# Altium footprint library SVP_Phoenix.PcbLib: 53 footprints (part 1 of 4)
Each footprint in its own frame and in the unit in brackets; x right, y up, seen from the top. Pads: shape width x height; smd on the part's side, far side on the other; paste and mask are expansions set on the pad; w line width, h text height; cw(c..) or ccw(c..) is an arc to the next point about the centre after c.
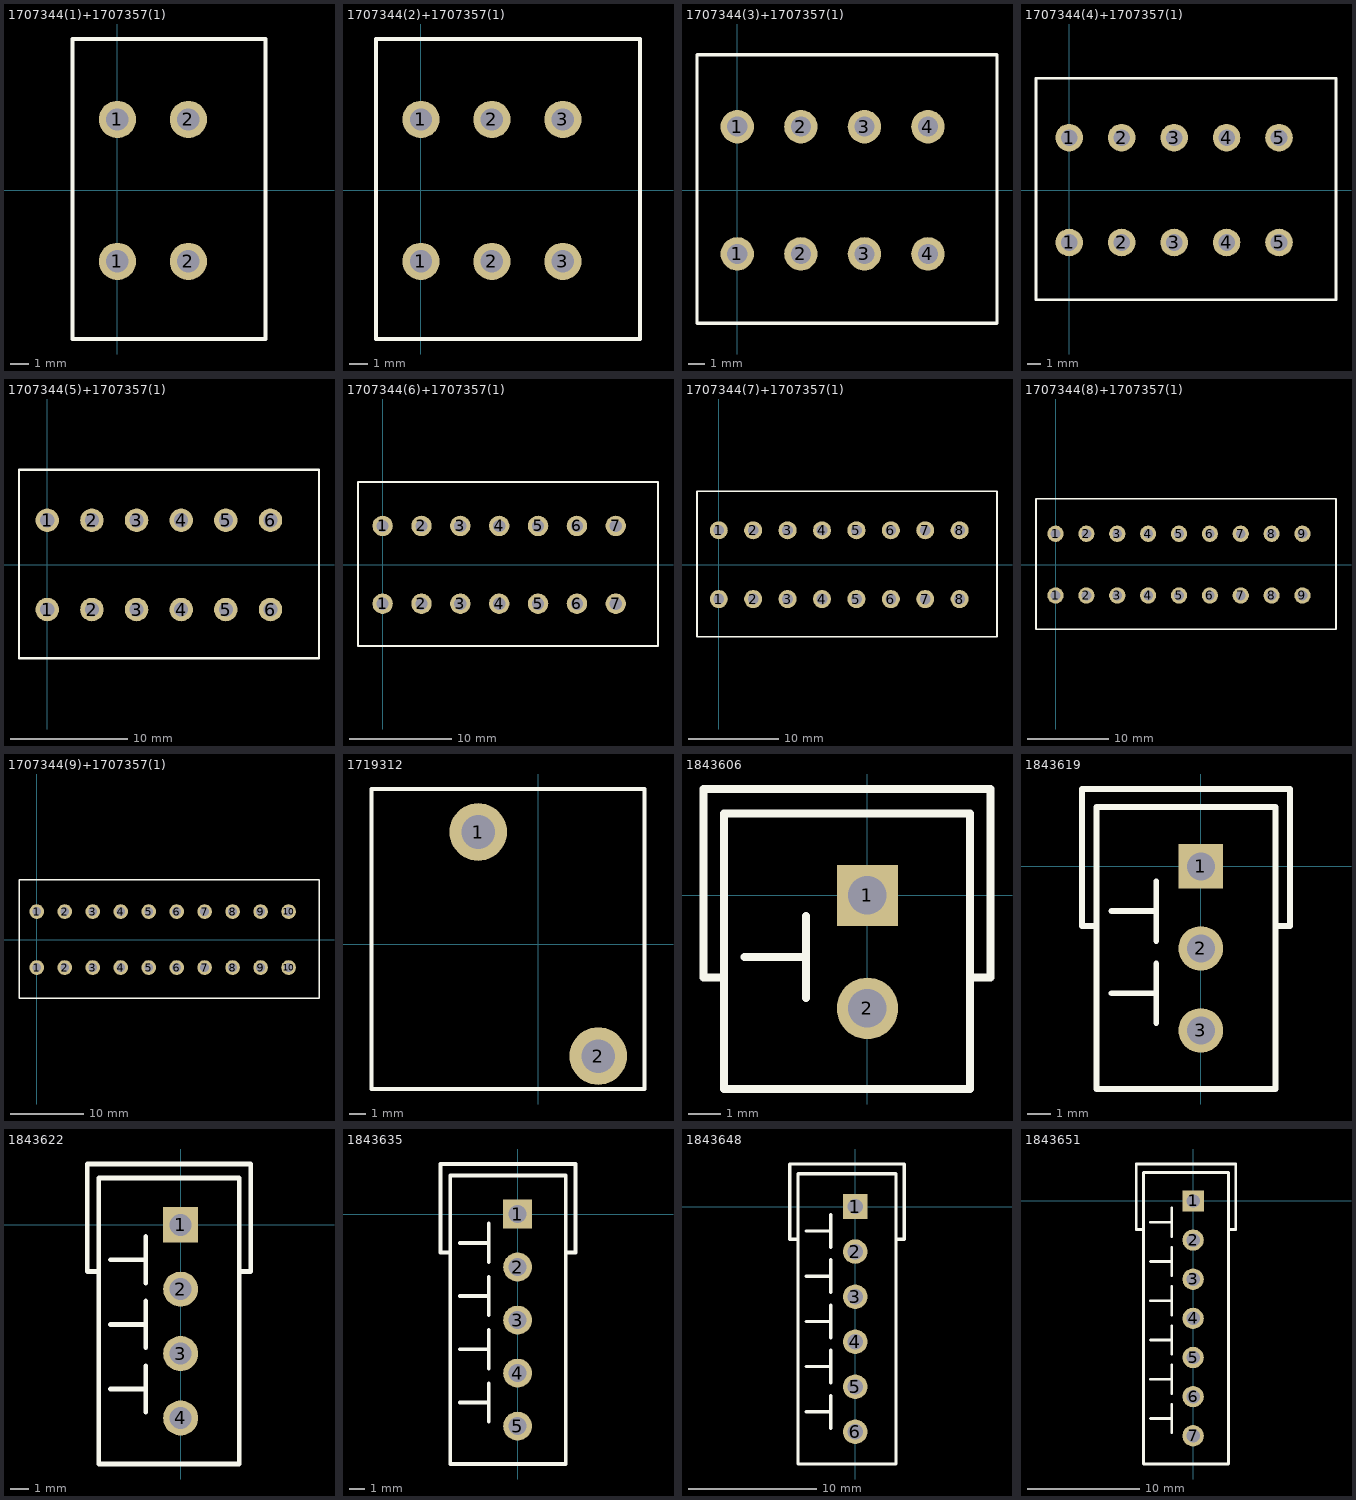
[diagram p0: the footprints below, top view; thin cyan lines are the x and y axes]

## 1707344(1)+1707357(1) [mm] "2 position 3.81mm spring terminals, vertical"
pads (4):
  round 2 hole 1.2: 1(0,-3.81) 1(0,3.81) 2(3.81,-3.81) 2(3.81,3.81)
Top Overlay:
  lines w0.203: -2.413,-7.976 -2.413,8.128 7.95,8.128 7.95,-7.976 -2.413,-7.976
3D body "1707344_01.stp": height 15.56, standoff -3.49, extent -2.311,-7.874 3.299,8.026
3D body "1707357_02.stp": height 15.56, standoff -3.49, extent 1.499,-7.874 7.849,8.026

## 1707344(2)+1707357(1) [mm] "3 position 3.81mm spring terminals, vertical"
pads (6):
  round 2 hole 1.2: 1(0,-3.81) 1(0,3.81) 2(3.81,-3.81) 2(3.81,3.81) 3(7.62,-3.81) 3(7.62,3.81)
Top Overlay:
  lines w0.203: -2.413,-7.976 11.76,-7.976 11.76,8.128 -2.413,8.128 -2.413,-7.976
3D body "1707344_01.stp": height 15.56, standoff -3.49, extent 1.499,-7.874 7.109,8.026
3D body "1707357_02.stp": height 15.56, standoff -3.49, extent 5.309,-7.874 11.659,8.026
3D body "1707344_01.stp": height 15.56, standoff -3.49, extent -2.311,-7.874 3.299,8.026

## 1707344(3)+1707357(1) [mm] "4 position 3.81mm spring terminals, vertical"
pads (8):
  round 2 hole 1.2: 1(0,-3.81) 1(0,3.81) 2(3.81,-3.81) 2(3.81,3.81) 3(7.62,-3.81) 3(7.62,3.81) 4(11.43,-3.81) 4(11.43,3.81)
Top Overlay:
  lines w0.203: -2.413,-7.976 15.57,-7.976 15.57,8.128 -2.413,8.128 -2.413,-7.976
3D body "1707344_01.stp": height 15.56, standoff -3.49, extent 5.309,-7.874 10.919,8.026
3D body "1707357_02.stp": height 15.56, standoff -3.49, extent 9.119,-7.874 15.469,8.026
3D body "1707344_01.stp": height 15.56, standoff -3.49, extent 1.499,-7.874 7.109,8.026
3D body "1707344_01.stp": height 15.56, standoff -3.49, extent -2.311,-7.874 3.299,8.026

## 1707344(4)+1707357(1) [mm] "5 position 3.81mm spring terminals, vertical"
pads (10):
  round 2 hole 1.2: 1(0,-3.81) 1(0,3.81) 2(3.81,-3.81) 2(3.81,3.81) 3(7.62,-3.81) 3(7.62,3.81) 4(11.43,-3.81) 4(11.43,3.81) 5(15.24,-3.81) 5(15.24,3.81)
Top Overlay:
  lines w0.203: -2.413,-7.976 19.38,-7.976 19.38,8.128 -2.413,8.128 -2.413,-7.976
3D body "1707344_01.stp": height 15.56, standoff -3.49, extent 5.309,-7.874 10.919,8.026
3D body "1707344_01.stp": height 15.56, standoff -3.49, extent 1.499,-7.874 7.109,8.026
3D body "1707344_01.stp": height 15.56, standoff -3.49, extent -2.311,-7.874 3.299,8.026
3D body "1707357_02.stp": height 15.56, standoff -3.49, extent 12.929,-7.874 19.279,8.026
3D body "1707344_01.stp": height 15.56, standoff -3.49, extent 9.119,-7.874 14.729,8.026

## 1707344(5)+1707357(1) [mm] "6 position 3.81mm spring terminals, vertical"
pads (12):
  round 2 hole 1.2: 1(0,-3.81) 1(0,3.81) 2(3.81,-3.81) 2(3.81,3.81) 3(7.62,-3.81) 3(7.62,3.81) 4(11.43,-3.81) 4(11.43,3.81) 5(15.24,-3.81) 5(15.24,3.81) 6(19.05,-3.81) 6(19.05,3.81)
Top Overlay:
  lines w0.203: -2.413,-7.976 23.19,-7.976 23.19,8.128 -2.413,8.128 -2.413,-7.976
3D body "1707344_01.stp": height 15.56, standoff -3.49, extent 5.309,-7.874 10.919,8.026
3D body "1707344_01.stp": height 15.56, standoff -3.49, extent 1.499,-7.874 7.109,8.026
3D body "1707344_01.stp": height 15.56, standoff -3.49, extent -2.311,-7.874 3.299,8.026
3D body "1707344_01.stp": height 15.56, standoff -3.49, extent 9.119,-7.874 14.729,8.026
3D body "1707357_02.stp": height 15.56, standoff -3.49, extent 16.739,-7.874 23.089,8.026
3D body "1707344_01.stp": height 15.56, standoff -3.49, extent 12.929,-7.874 18.539,8.026

## 1707344(6)+1707357(1) [mm] "7 position 3.81mm spring terminals, vertical"
pads (14):
  round 2 hole 1.2: 1(0,-3.81) 1(0,3.81) 2(3.81,-3.81) 2(3.81,3.81) 3(7.62,-3.81) 3(7.62,3.81) 4(11.43,-3.81) 4(11.43,3.81) 5(15.24,-3.81) 5(15.24,3.81) 6(19.05,-3.81) 6(19.05,3.81) 7(22.86,-3.81) 7(22.86,3.81)
Top Overlay:
  lines w0.203: -2.413,-7.976 -2.413,8.128 27,8.128 27,-7.976 -2.413,-7.976
3D body "1707344_01.stp": height 15.56, standoff -3.49, extent 16.739,-7.874 22.349,8.026
3D body "1707357_02.stp": height 15.56, standoff -3.49, extent 20.549,-7.874 26.899,8.026
3D body "1707344_01.stp": height 15.56, standoff -3.49, extent 12.929,-7.874 18.539,8.026
3D body "1707344_01.stp": height 15.56, standoff -3.49, extent 9.119,-7.874 14.729,8.026
3D body "1707344_01.stp": height 15.56, standoff -3.49, extent -2.311,-7.874 3.299,8.026
3D body "1707344_01.stp": height 15.56, standoff -3.49, extent 1.499,-7.874 7.109,8.026
3D body "1707344_01.stp": height 15.56, standoff -3.49, extent 5.309,-7.874 10.919,8.026

## 1707344(7)+1707357(1) [mm] "8 position 3.81mm spring terminals, vertical"
pads (16):
  round 2 hole 1.2: 1(0,-3.81) 1(0,3.81) 2(3.81,-3.81) 2(3.81,3.81) 3(7.62,-3.81) 3(7.62,3.81) 4(11.43,-3.81) 4(11.43,3.81) 5(15.24,-3.81) 5(15.24,3.81) 6(19.05,-3.81) 6(19.05,3.81) 7(22.86,-3.81) 7(22.86,3.81) 8(26.67,-3.81) 8(26.67,3.81)
Top Overlay:
  lines w0.203: -2.413,-7.976 30.81,-7.976 30.81,8.128 -2.413,8.128 -2.413,-7.976
3D body "1707344_01.stp": height 15.56, standoff -3.49, extent 20.549,-7.874 26.159,8.026
3D body "1707357_02.stp": height 15.56, standoff -3.49, extent 24.359,-7.874 30.709,8.026
3D body "1707344_01.stp": height 15.56, standoff -3.49, extent 5.309,-7.874 10.919,8.026
3D body "1707344_01.stp": height 15.56, standoff -3.49, extent 1.499,-7.874 7.109,8.026
3D body "1707344_01.stp": height 15.56, standoff -3.49, extent -2.311,-7.874 3.299,8.026
3D body "1707344_01.stp": height 15.56, standoff -3.49, extent 9.119,-7.874 14.729,8.026
3D body "1707344_01.stp": height 15.56, standoff -3.49, extent 12.929,-7.874 18.539,8.026
3D body "1707344_01.stp": height 15.56, standoff -3.49, extent 16.739,-7.874 22.349,8.026

## 1707344(8)+1707357(1) [mm] "9 position 3.81mm spring terminals, vertical"
pads (18):
  round 2 hole 1.2: 1(0,-3.81) 1(0,3.81) 2(3.81,-3.81) 2(3.81,3.81) 3(7.62,-3.81) 3(7.62,3.81) 4(11.43,-3.81) 4(11.43,3.81) 5(15.24,-3.81) 5(15.24,3.81) 6(19.05,-3.81) 6(19.05,3.81) 7(22.86,-3.81) 7(22.86,3.81) 8(26.67,-3.81) 8(26.67,3.81) 9(30.48,-3.81) 9(30.48,3.81)
Top Overlay:
  lines w0.203: -2.413,-7.976 -2.413,8.128 34.62,8.128 34.62,-7.976 -2.413,-7.976
3D body "1707344_01.stp": height 15.56, standoff -3.49, extent 24.359,-7.874 29.969,8.026
3D body "1707357_02.stp": height 15.56, standoff -3.49, extent 28.169,-7.874 34.519,8.026
3D body "1707344_01.stp": height 15.56, standoff -3.49, extent 16.739,-7.874 22.349,8.026
3D body "1707344_01.stp": height 15.56, standoff -3.49, extent 12.929,-7.874 18.539,8.026
3D body "1707344_01.stp": height 15.56, standoff -3.49, extent 9.119,-7.874 14.729,8.026
3D body "1707344_01.stp": height 15.56, standoff -3.49, extent -2.311,-7.874 3.299,8.026
3D body "1707344_01.stp": height 15.56, standoff -3.49, extent 1.499,-7.874 7.109,8.026
3D body "1707344_01.stp": height 15.56, standoff -3.49, extent 5.309,-7.874 10.919,8.026
3D body "1707344_01.stp": height 15.56, standoff -3.49, extent 20.549,-7.874 26.159,8.026

## 1707344(9)+1707357(1) [mm] "10 position 3.81mm spring terminals, vertical"
pads (20):
  round 2 hole 1.2: 1(0,-3.81) 1(0,3.81) 2(3.81,-3.81) 2(3.81,3.81) 3(7.62,-3.81) 3(7.62,3.81) 4(11.43,-3.81) 4(11.43,3.81) 5(15.24,-3.81) 5(15.24,3.81) 6(19.05,-3.81) 6(19.05,3.81) 7(22.86,-3.81) 7(22.86,3.81) 8(26.67,-3.81) 8(26.67,3.81) 9(30.48,-3.81) 9(30.48,3.81) 10(34.29,-3.81) 10(34.29,3.81)
Top Overlay:
  lines w0.203: -2.413,-7.976 38.43,-7.976 38.43,8.128 -2.413,8.128 -2.413,-7.976
3D body "1707344_01.stp": height 15.56, standoff -3.49, extent 28.169,-7.874 33.779,8.026
3D body "1707357_02.stp": height 15.56, standoff -3.49, extent 31.979,-7.874 38.329,8.026
3D body "1707344_01.stp": height 15.56, standoff -3.49, extent 20.549,-7.874 26.159,8.026
3D body "1707344_01.stp": height 15.56, standoff -3.49, extent 5.309,-7.874 10.919,8.026
3D body "1707344_01.stp": height 15.56, standoff -3.49, extent 1.499,-7.874 7.109,8.026
3D body "1707344_01.stp": height 15.56, standoff -3.49, extent -2.311,-7.874 3.299,8.026
3D body "1707344_01.stp": height 15.56, standoff -3.49, extent 9.119,-7.874 14.729,8.026
3D body "1707344_01.stp": height 15.56, standoff -3.49, extent 12.929,-7.874 18.539,8.026
3D body "1707344_01.stp": height 15.56, standoff -3.49, extent 16.739,-7.874 22.349,8.026
3D body "1707344_01.stp": height 15.56, standoff -3.49, extent 24.359,-7.874 29.969,8.026

## 1719312 [mm] "PCB terminal block - SPT 5/ 2-V-7,5-ZB - 1719312"
pads (2):
  round 3.6 hole 2.1: 1(-3.75,7) 2(3.75,-7)
Top Overlay:
  lines w0.254: -10.423,-9.057 -10.423,9.688 6.646,9.688 6.646,-9.057 -10.423,-9.057
3D body "1719312_03.stp": height 24.17, standoff -4.59, extent -10.291,-8.935 6.519,9.565

## 1843606 [mil] "TERM BLOCK HDR 2POS VERT 3.5MM"
pads (2):
  rect 75x75 hole 47: 1(0,0)
  round 75 hole 47: 2(0,-137.8)
Top Overlay:
  lines w10: -175,-100 -200,-100 -200,130 150,130 150,-100 130,-100 ; -150,-75 -75,-75 ; -75,-125 -75,-25 ; -175,-236.22 125,-236.22 125,100 -175,100 -175,-236.22
3D body "1843606.stp": height 362.7, standoff -133.36, extent -167.32,-234.25 118.11,96.46

## 1843619 [mil] "3 Position Terminal Block Header, Male Pins, Shrouded (4 Side) 0.138\" (3.50mm) Vertical Through Hole"
pads (3):
  rect 75x75 hole 47: 1(0,0)
  round 75 hole 47: 2(0,-137.8) 3(0,-275.59)
Top Overlay:
  lines w10: -175,-100 -200,-100 -200,130 150,130 150,-100 130,-100 ; -150,-213.19 -75,-213.19 ; -150,-75 -75,-75 ; -75,-263.19 -75,-163.19 ; -75,-125 -75,-25 ; -175,-374.02 -175,100 125,100 125,-374.02 -175,-374.02
3D body "1843619.stp": height 362.7, standoff -133.36, extent -167.32,-372.05 118.11,96.46

## 1843622 [mil]
pads (4):
  rect 75x75 hole 47: 1(0,0)
  round 75 hole 47: 2(0,-137.8) 3(0,-275.59) 4(0,-413.39)
Top Overlay:
  lines w10: -175,-100 -200,-100 -200,130 150,130 150,-100 130,-100 ; -150,-351.38 -75,-351.38 ; -150,-213.19 -75,-213.19 ; -150,-75 -75,-75 ; -75,-401.38 -75,-301.38 ; -75,-263.19 -75,-163.19 ; -75,-125 -75,-25 ; -175,-511.81 125,-511.81 125,100 -175,100 -175,-511.81
3D body "1843622.stp": height 362.71, standoff -133.36, extent -167.72,-510 117.72,96.3

## 1843635 [mil]
pads (5):
  rect 75x75 hole 47: 1(0,0)
  round 75 hole 47: 2(0,-137.8) 3(0,-275.59) 4(0,-413.39) 5(0,-551.18)
Top Overlay:
  lines w10: -175,-100 -200,-100 -200,130 150,130 150,-100 130,-100 ; -150,-489.57 -75,-489.57 ; -150,-351.38 -75,-351.38 ; -150,-213.19 -75,-213.19 ; -150,-75 -75,-75 ; -75,-539.57 -75,-439.57 ; -75,-401.38 -75,-301.38 ; -75,-263.19 -75,-163.19 ; -75,-125 -75,-25 ; -175,-649.61 125,-649.61 125,100 -175,100 -175,-649.61
3D body "1843635.stp": height 362.71, standoff -133.36, extent -167.72,-647.1 117.72,97

## 1843648 [mil]
pads (6):
  rect 75x75 hole 47: 1(0,0)
  round 75 hole 47: 2(0,-137.8) 3(0,-275.59) 4(0,-413.39) 5(0,-551.18) 6(0,-688.98)
Top Overlay:
  lines w10: -175,-100 -200,-100 -200,130 150,130 150,-100 130,-100 ; -150,-627.76 -75,-627.76 ; -150,-489.57 -75,-489.57 ; -150,-351.38 -75,-351.38 ; -150,-213.19 -75,-213.19 ; -150,-75 -75,-75 ; -75,-677.76 -75,-577.76 ; -75,-539.57 -75,-439.57 ; -75,-401.38 -75,-301.38 ; -75,-263.19 -75,-163.19 ; -75,-125 -75,-25 ; -175,-787.4 -175,100 125,100 125,-787.4 -175,-787.4
3D body "1843648.stp": height 362.71, standoff -133.36, extent -167.72,-785 117.72,96.89

## 1843651 [mil]
pads (7):
  rect 75x75 hole 47: 1(0,0)
  round 75 hole 47: 2(0,-137.8) 3(0,-275.59) 4(0,-413.39) 5(0,-551.18) 6(0,-688.98) 7(0,-826.77)
Top Overlay:
  lines w10: -175,-100 -200,-100 -200,130 150,130 150,-100 130,-100 ; -150,-765.55 -75,-765.55 ; -150,-627.76 -75,-627.76 ; -150,-489.57 -75,-489.57 ; -150,-351.38 -75,-351.38 ; -150,-213.19 -75,-213.19 ; -150,-75 -75,-75 ; -75,-815.55 -75,-715.55 ; -75,-677.76 -75,-577.76 ; -75,-539.57 -75,-439.57 ; -75,-401.38 -75,-301.38 ; -75,-263.19 -75,-163.19 ; -75,-125 -75,-25 ; -175,-926 125,-926 125,100 -175,100 -175,-926
3D body "1843651.stp": height 362.71, standoff -133.36, extent -167.72,-923 117.72,96.69